# Altium footprint library alex_footprint.PcbLib: 262 footprints (part 5 of 17)
Each footprint in its own frame and in the unit in brackets; x right, y up, seen from the top. Pads: shape width x height; smd on the part's side, far side on the other; paste and mask are expansions set on the pad; w line width, h text height; cw(c..) or ccw(c..) is an arc to the next point about the centre after c.
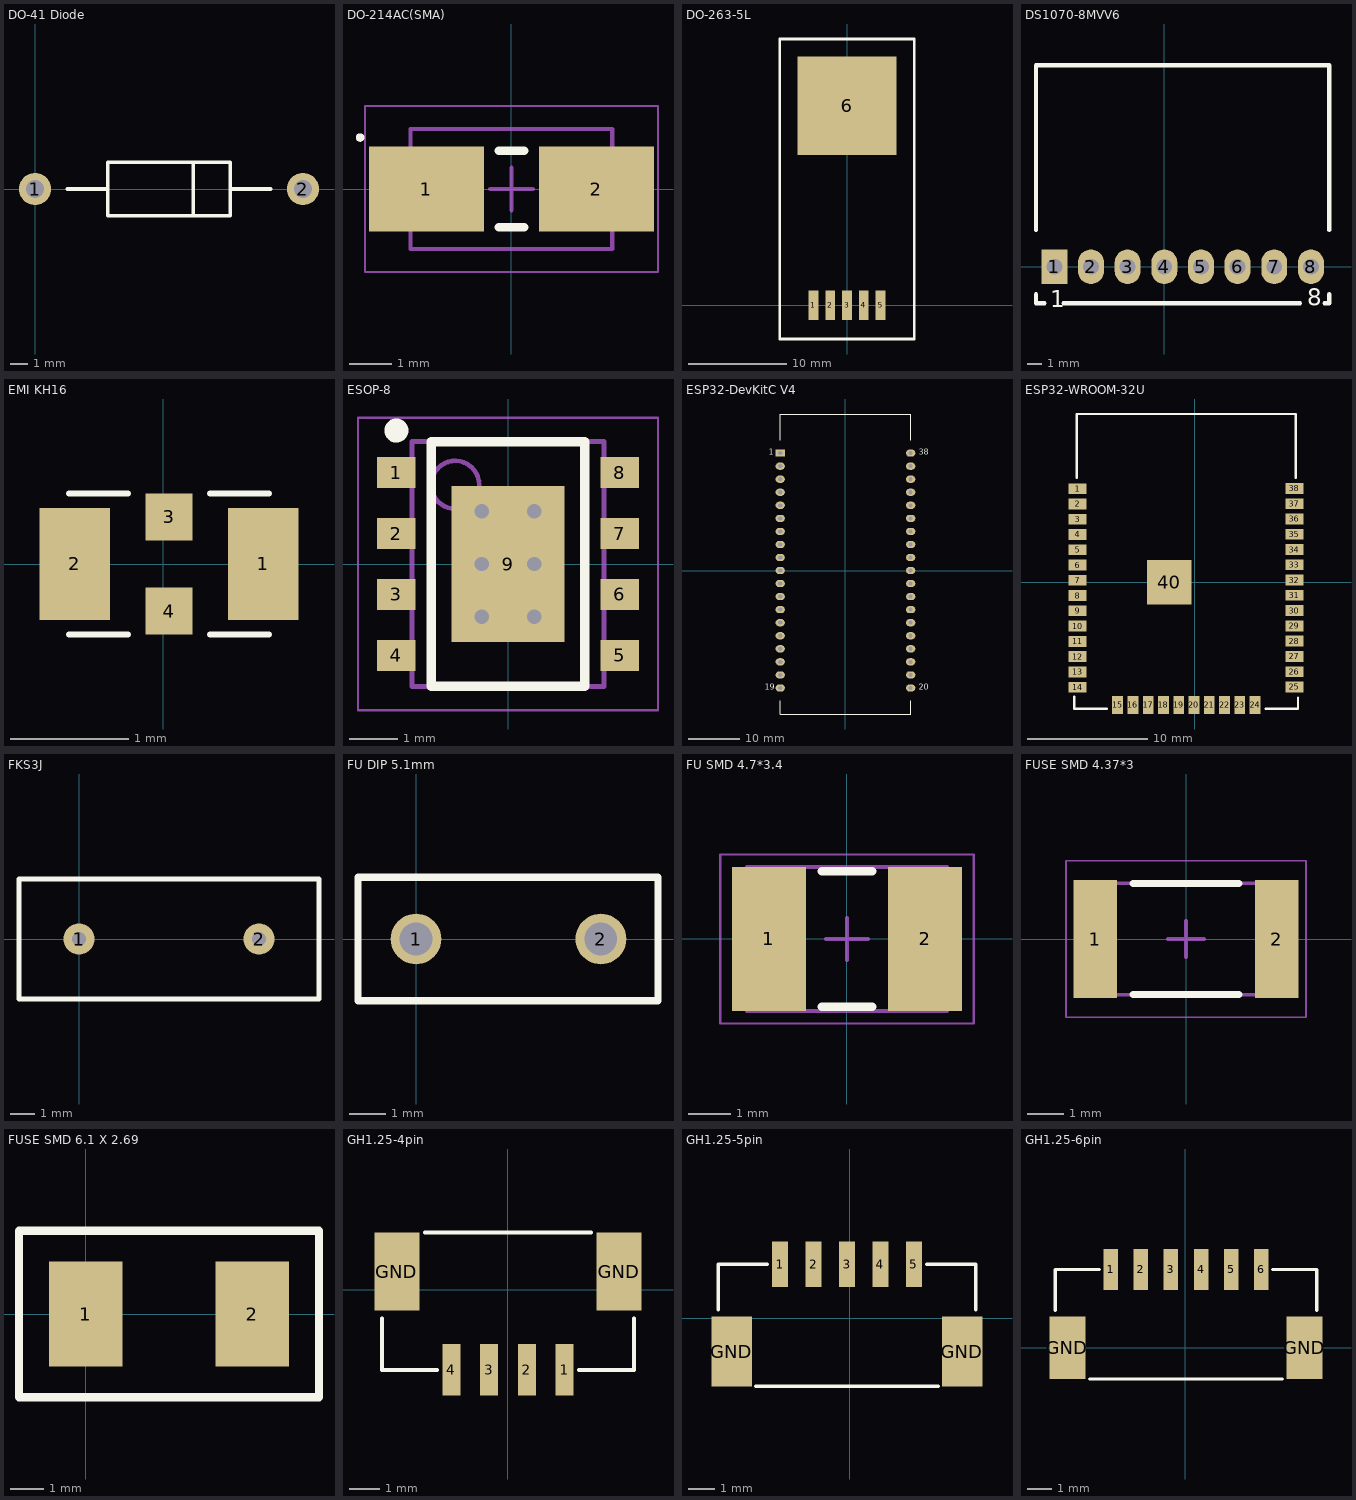
[diagram p4: the footprints below, top view; thin cyan lines are the x and y axes]

## DO-41 Diode [mm]
pads (2):
  round 1.8 hole 1: 1(0,0) 2(15,0)
Top Overlay:
  lines w0.2: 1.8,0 4.075,0 ; 8.858,-1.5 8.858,1.5 ; 10.925,0 13.2,0 ; 4.075,0 4.075,-1.5 10.925,-1.5 10.925,1.5 4.075,1.5 4.075,0

## DO-214AC(SMA) [mm]
height 2.3
pads (2):
  rect 2.7x2 smd: 1(-2,0) 2(2,0)
Top Overlay:
  circle w0.1: c-3.562,1.212 r0.05
  lines w0.2: -0.3,-0.9 0.3,-0.9 ; -0.3,0.9 0.3,0.9
Mechanical 13:
  lines w0.1: -2.375,-1.415 -2.375,1.415 2.375,1.415 2.375,-1.415 -2.375,-1.415
Mechanical 15:
  lines w0.05: -3.45,-1.95 -3.45,1.95 3.45,1.95 3.45,-1.95 -3.45,-1.95
  lines w0.1: -0.5,0 0.5,0 ; 0,-0.5 0,0.5
3D body: height 2.3, standoff 0, extent -1.285,-1.415 1.285,1.415
3D body: height 2.3, standoff 0, extent -2.375,-1.415 -1.285,1.415
3D body: height 2.3, standoff 0, extent 1.285,-1.415 2.375,1.415

## DO-263-5L [mm]
height 5
pads (6):
  rect 1x3 smd: 1(-3.4,0) 2(-1.7,0) 3(0,0) 4(1.7,0) 5(3.4,0)
  rect 10x10 smd: 6(0,20.25)
Top Overlay:
  lines w0.254: -6.8,-3.4 6.8,-3.4 6.8,27 -6.8,27 -6.8,-3.4

## DS1070-8MVV6 [mm]
pads (8):
  rect 1.8x2.4 hole 1.1 unplated mask+0.2: 1(-7.62,0)
  oval 1.8x2.4 hole 1.1 unplated mask+0.2: 2(-5.08,0) 3(-2.54,0) 4(0,0) 5(2.54,0) 6(5.08,0) 7(7.62,0) 8(10.16,0)
Top Overlay:
  lines w0.3: -8.89,-1.905 -8.89,-2.54 -8.3,-2.54 ; -8.89,2.54 -8.89,8.89 -8.89,13.97 11.43,13.97 11.43,2.54 ; -6.985,-2.54 9.4,-2.54 ; 11.1,-2.54 11.43,-2.54 11.43,-1.905
  text "8" at 9.9,-3.1 h2
  text "1" at -7.9,-3.2 h2

## EMI KH16 [mm]
pads (4):
  rect 0.6x0.95 smd mask+0.026: 1(0.85,0) 2(-0.75,0)
  rect 0.4x0.4 smd mask+0.026: 3(0.05,0.4) 4(0.05,-0.4)
Top Overlay:
  lines w0.051: -0.8,-0.6 -0.3,-0.6 ; -0.8,0.6 -0.3,0.6 ; 0.4,-0.6 0.9,-0.6 ; 0.4,0.6 0.9,0.6

## ESOP-8 [mm]
height 1.7
pads (9):
  rect 0.8x0.65 smd: 1(-2.325,1.905) 2(-2.325,0.635) 3(-2.325,-0.635) 4(-2.325,-1.905) 5(2.325,-1.905) 6(2.325,-0.635) 7(2.325,0.635) 8(2.325,1.905)
  rect 2.36x3.25 smd: 9(0,0)
via -0.55,1.1 diameter 0.7 hole 0.3
via 0.55,1.1 diameter 0.7 hole 0.3
via -0.55,0 diameter 0.7 hole 0.3
via 0.55,0 diameter 0.7 hole 0.3
via -0.55,-1.1 diameter 0.7 hole 0.3
via 0.55,-1.1 diameter 0.7 hole 0.3
Top Overlay:
  circle w0.25: c-2.325,2.78 r0.125
  lines w0.2: -1.6,-2.55 -1.6,2.55 1.6,2.55 1.6,-2.55 -1.6,-2.55
Mechanical 13:
  circle w0.1: c-1.1,1.65 r0.5
  lines w0.1: -2,-2.55 -2,2.55 2,2.55 2,-2.55 -2,-2.55
Mechanical 15:
  lines w0.05: -3.125,-3.05 -3.125,3.05 3.125,3.05 3.125,-3.05 -3.125,-3.05
  lines w0.1: -0.5,0 0.5,0 ; 0,-0.5 0,0.5
3D body: height 1.7, standoff 0, extent -2,-2.55 2,2.55

## ESP32-DevKitC V4 [mm]
pads (38):
  rect 1.8x1.4 hole 0.8 unplated: 1(-12.7,22.86)
  oval 1.8x1.4 hole 0.8 unplated: 2(-12.7,20.32) 3(-12.7,17.78) 4(-12.7,15.24) 5(-12.7,12.7) 6(-12.7,10.16) 7(-12.7,7.62) 8(-12.7,5.08) 9(-12.7,2.54) 10(-12.7,0) 11(-12.7,-2.54) 12(-12.7,-5.08) 13(-12.7,-7.62) 14(-12.7,-10.16) 15(-12.7,-12.7) 16(-12.7,-15.24) 17(-12.7,-17.78) 18(-12.7,-20.32) 19(-12.7,-22.86) 20(12.7,-22.86) 21(12.7,-20.32) 22(12.7,-17.78) 23(12.7,-15.24) 24(12.7,-12.7) 25(12.7,-10.16) 26(12.7,-7.62) 27(12.7,-5.08) 28(12.7,-2.54) 29(12.7,0) 30(12.7,2.54) 31(12.7,5.08) 32(12.7,7.62) 33(12.7,10.16) 34(12.7,12.7) 35(12.7,15.24) 36(12.7,17.78) 37(12.7,20.32) 38(12.7,22.86)
Top Overlay:
  lines w0.2: -12.7,-25.4 -12.7,-27.94 12.7,-27.94 12.7,-25.4 ; -12.7,25.4 -12.7,30.48 12.7,30.48 12.7,25.4
  text "38" at 14.3,22.2 h2
  text "20" at 14.3,-23.6 h2
  text "19" at -15.7,-23.6 h2
  text "1" at -14.9,22.2 h2

## ESP32-WROOM-32U [mm]
pads (39):
  rect 1.5x0.9 smd: 1(-9.73,7.79) 2(-9.73,6.52) 3(-9.73,5.25) 4(-9.73,3.98) 5(-9.73,2.71) 6(-9.73,1.44) 7(-9.73,0.17) 8(-9.73,-1.1) 9(-9.73,-2.37) 10(-9.73,-3.64) 11(-9.73,-4.91) 12(-9.73,-6.18) 13(-9.73,-7.45) 14(-9.73,-8.72) 25(8.3,-8.7) 26(8.3,-7.43) 27(8.3,-6.16) 28(8.3,-4.89) 29(8.3,-3.62) 30(8.3,-2.35) 31(8.3,-1.08) 32(8.3,0.19) 33(8.3,1.46) 34(8.3,2.73) 35(8.3,4) 36(8.3,5.27) 37(8.3,6.54) 38(8.3,7.81)
  rect 0.9x1.5 smd: 15(-6.4,-10.2) 16(-5.13,-10.2) 17(-3.86,-10.2) 18(-2.59,-10.2) 19(-1.32,-10.2) 20(-0.05,-10.2) 21(1.22,-10.2) 22(2.49,-10.2) 23(3.76,-10.2) 24(5.03,-10.2)
  rect 3.7x3.7 smd: 40(-2.1,0)
Top Overlay:
  lines w0.2: -10,-9.5 -10,-10.5 -7.3,-10.5 ; -9.8,8.7 -9.8,14 8.4,14 8.4,8.7 ; 5.9,-10.5 8.6,-10.5 8.6,-9.6

## FKS3J [mm]
pads (2):
  round 1.3 hole 0.6: 1(0,0) 2(7.5,0)
Top Overlay:
  lines w0.2: -2.5,-2.5 -2.5,2.5 0,2.5 7.5,2.5 10,2.5 10,-2.5 7.5,-2.5 0,-2.5 -2.5,-2.5

## FU DIP 5.1mm [mm]
pads (2):
  round 1.4 hole 0.9: 1(0,0) 2(5.1,0)
Top Overlay:
  lines w0.2: -1.6,-1.7 -1.6,1.7 6.675,1.7 6.675,0 6.675,-1.7 -1.6,-1.7

## FU SMD 4.7*3.4 [mm] "Предохранитель SMD"
height 2
pads (2):
  rect 1.75x3.4 smd: 1(-1.85,0) 2(1.85,0)
Top Overlay:
  lines w0.2: -0.6,-1.6 0.6,-1.6 ; -0.6,1.6 0.6,1.6
Mechanical 13:
  lines w0.1: -2.365,-1.705 -2.365,1.705 2.365,1.705 2.365,-1.705 -2.365,-1.705
Mechanical 15:
  lines w0.05: -3,-2 -3,2 3,2 3,-2 -3,-2
  lines w0.1: -0.5,0 0.5,0 ; 0,-0.5 0,0.5
3D body: height 2, standoff 0, extent -1.615,-1.705 1.615,1.705
3D body: height 2, standoff 0, extent -2.365,-1.705 -1.615,1.705
3D body: height 2, standoff 0, extent 1.615,-1.705 2.365,1.705

## FUSE SMD 4.37*3 [mm]
height 1
pads (2):
  rect 1.2x3.25 smd: 1(-2.5,0) 2(2.5,0)
Top Overlay:
  lines w0.2: -1.45,-1.525 1.45,-1.525 ; -1.45,1.525 1.45,1.525
Mechanical 13:
  lines w0.1: -2.185,-1.535 2.185,-1.535 2.185,1.535 -2.185,1.535 -2.185,-1.535
Mechanical 15:
  lines w0.05: -3.3,-2.15 3.3,-2.15 3.3,2.15 -3.3,2.15 -3.3,-2.15
  lines w0.1: -0.5,0 0.5,0 ; 0,-0.5 0,0.5
3D body: height 1, standoff 0, extent 1.885,-1.535 2.185,1.535
3D body: height 1, standoff 0, extent -2.185,-1.535 -1.885,1.535
3D body: height 1, standoff 0, extent -1.885,-1.535 1.885,1.535

## FUSE SMD 6.1 X 2.69 [mm]
pads (2):
  rect 2.2x3.15 smd: 1(0,0) 2(5,0)
Top Overlay:
  lines w0.254: -2,-2.5 -2,2.5 7,2.5 7,-2.5 -2,-2.5

## GH1.25-4pin [mm]
pads (6):
  rect 0.6x1.7 smd mask+0.051: 1(1.875,-2.65) 2(0.625,-2.65) 3(-0.625,-2.65) 4(-1.875,-2.65)
  rect 1.5x2.58 smd mask+0.051: GND(-3.675,0.6) GND(3.675,0.6)
Top Overlay:
  lines w0.127: -4.175,-0.95 -4.175,-2.65 -2.35,-2.65 ; -2.75,1.9 2.75,1.9 ; 2.35,-2.65 4.175,-2.65 4.175,-0.95

## GH1.25-5pin [mm]
pads (7):
  rect 0.6x1.7 smd mask+0.051: 1(-2.6,2) 2(-1.35,2) 3(-0.1,2) 4(1.15,2) 5(2.4,2)
  rect 1.5x2.6 smd mask+0.051: GND(-4.4,-1.25) GND(4.2,-1.25)
Top Overlay:
  lines w0.127: -4.9,0.3 -4.9,2 -3.075,2 ; -3.5,-2.55 3.3,-2.55 ; 2.875,2 4.7,2 4.7,0.3

## GH1.25-6pin [mm]
pads (8):
  rect 0.6x1.7 smd mask+0.051: 1(-3.1,3.25) 2(-1.85,3.25) 3(-0.6,3.25) 4(0.65,3.25) 5(1.9,3.25) 6(3.15,3.25)
  rect 1.5x2.6 smd mask+0.051: GND(-4.9,0) GND(4.95,0)
Top Overlay:
  lines w0.127: -5.4,1.55 -5.4,3.25 -3.575,3.25 ; -3.975,-1.3 4.025,-1.3 ; 3.625,3.25 5.45,3.25 5.45,1.55